# Altium footprint library TE0706.PcbLib: 46 footprints (part 1 of 3)
Each footprint in its own frame and in the unit in brackets; x right, y up, seen from the top. Pads: shape width x height; smd on the part's side, far side on the other; paste and mask are expansions set on the pad; w line width, h text height; cw(c..) or ccw(c..) is an arc to the next point about the centre after c.
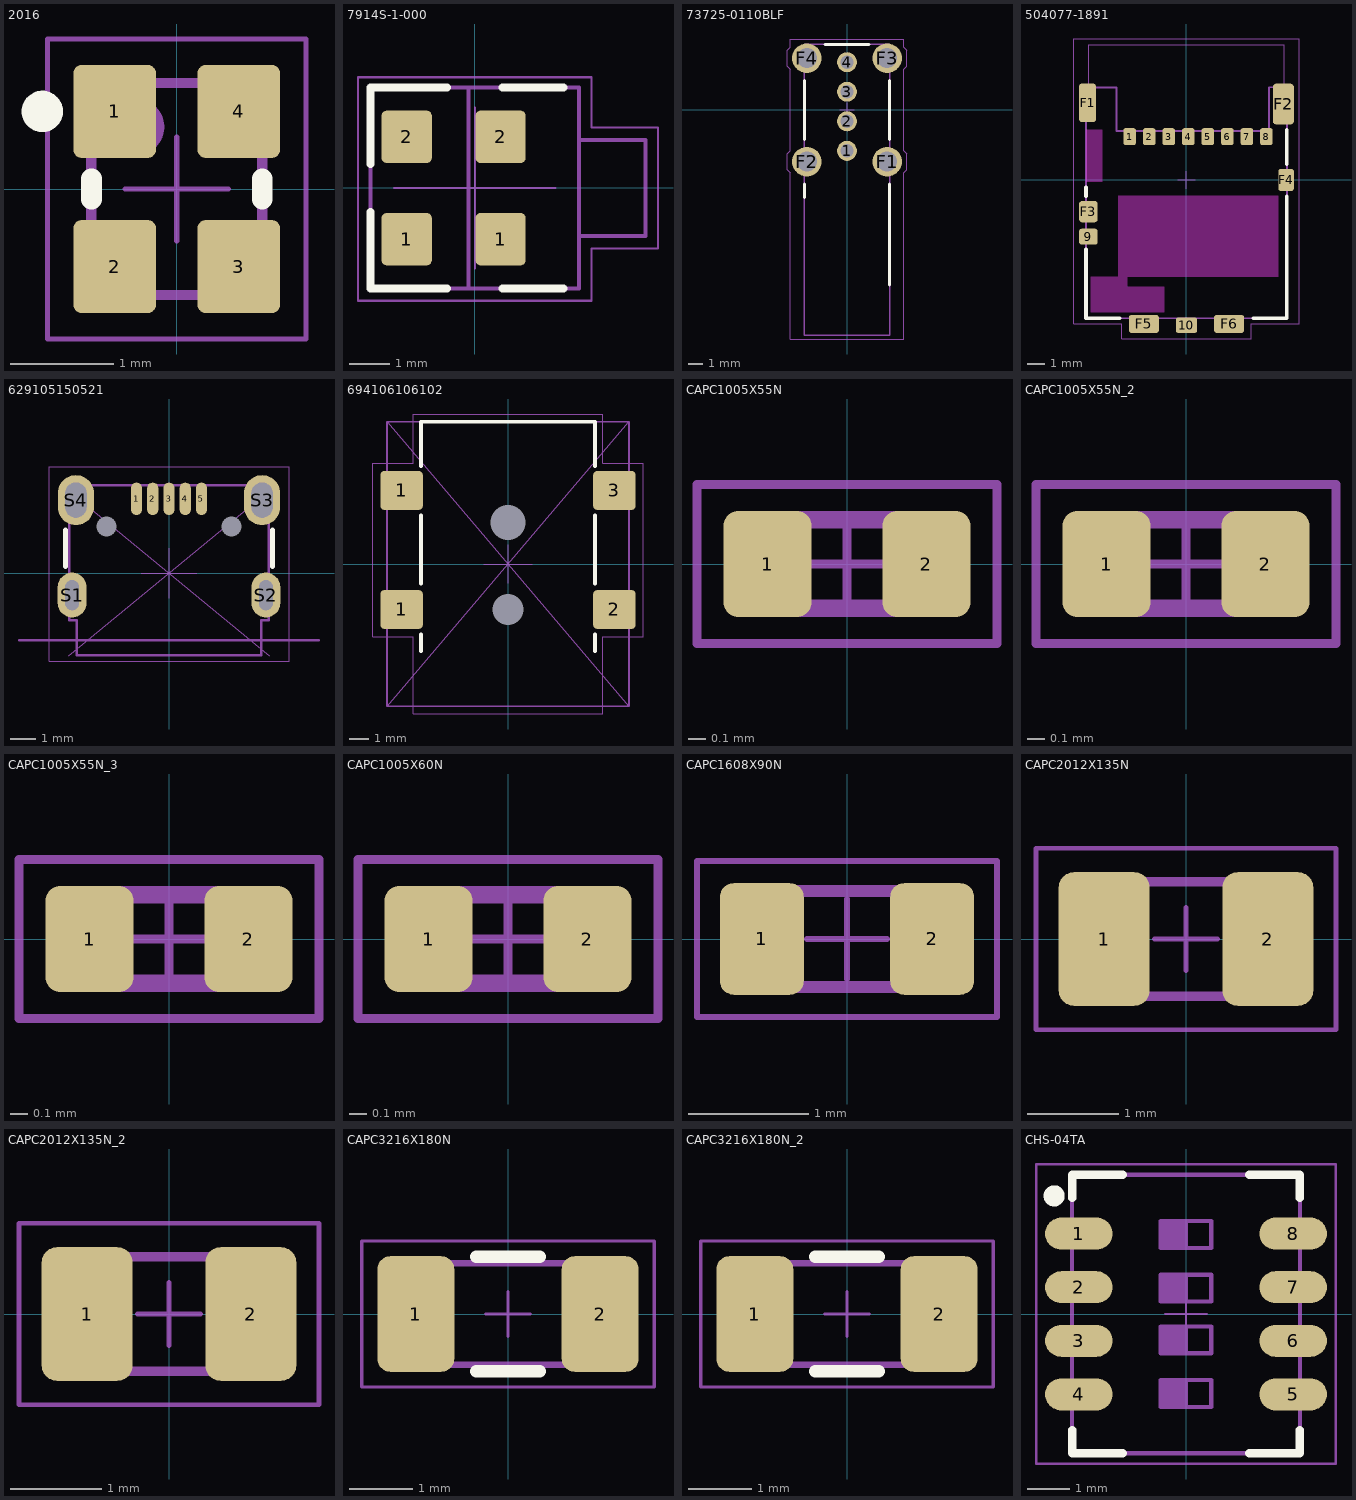
[diagram p0: the footprints below, top view; thin cyan lines are the x and y axes]

## 2016 [mm]
height 0.8
pads (4):
  rrect20% 0.8x0.9 smd: 1(-0.6,0.75) 2(-0.6,-0.75) 3(0.6,-0.75) 4(0.6,0.75)
Top Overlay:
  circle w0.2: c-1.3,0.75 r0.1
  lines w0.2: -0.825,-0.1 -0.825,0.1 ; 0.825,-0.1 0.825,0.1
Mechanical 13:
  circle w0.28: c-0.4,0.6 r0.14
  lines w0.1: -0.825,-1.025 -0.825,1.025 0.825,1.025 ; -0.825,-1.025 -0.825,-1.025 ; -0.825,-1.025 0.825,-1.025 0.825,1.025 ; 0.825,1.025 0.825,1.025
  text ".Designator" at -0.51,2.92 h1
Mechanical 15:
  lines w0.05: -0.5,0 0.5,0 ; 0,-0.5 0,0.5 ; -1.25,-1.45 1.25,-1.45 1.25,1.45 -1.25,1.45 -1.25,-1.45
3D body: height 0.81, standoff 0, extent -0.6,0.4 -0.2,0.798
3D body: height 0.8, standoff 0, extent -0.825,-1.025 0.825,1.025

## 7914S-1-000 [mm]
height 5.44
pads (4):
  rrect20% 1.25x1.3 smd: 1(-1.69,-1.27) 1(0.64,-1.27) 2(-1.69,1.27) 2(0.64,1.27)
Top Overlay:
  lines w0.2: -2.59,-0.6 -2.59,-2.5 -0.69,-2.5 ; -2.59,0.6 -2.59,2.5 -0.69,2.5 ; 0.69,-2.5 2.2,-2.5 ; 0.69,2.5 2.2,2.5
Mechanical 13:
  lines w0.1: -0.16,-2.5 -0.16,2.5 ; 2.59,-1.19 4.24,-1.19 4.24,1.19 2.59,1.19 ; -2.59,-2.5 2.59,-2.5 2.59,2.5 -2.59,2.5 -2.59,-2.5
  text ".Designator" at -0.82,-0.9 h1
Mechanical 15:
  lines w0.05: -2,0 2,0 ; 0,-2 0,2 ; -2.9,-2.8 -2.9,2.75 2.9,2.75 2.9,1.5 4.55,1.5 4.55,-1.5 2.9,-1.5 2.9,-2.8 -2.9,-2.8
3D body "7914S-1-000.stp": height 5.4, standoff -0.04, extent -2.6,-2.524 4.233,2.524

## 73725-0110BLF [mm]
height 13.83
pads (8):
  round 1.35 hole 0.9: 1(0,-2.77) 2(0,-0.77) 3(0,1.23) 4(0,3.23)
  round 2 hole 1.35: F1(2.72,-3.5) F2(-2.72,-3.5) F3(2.72,3.5) F4(-2.72,3.5)
Top Overlay:
  lines w0.2: -2.88,-5.921 -2.88,-5 ; -2.88,-2 -2.88,2 ; -1.5,4.44 1.5,4.44 ; 2.88,-11.851 2.88,-5 ; 2.88,-2 2.88,2
Mechanical 13:
  lines w0.1: -2.88,-15.26 2.88,-15.26 2.88,4.44 -2.88,4.44 -2.88,-15.26
  text ".Designator" at -0.98,-2.69 h1
Mechanical 15:
  lines w0.05: -0.5,0 0.5,0 ; 0,-0.5 0,0.5 ; -4.05,-4.05 -3.85,-4.25 -3.85,-15.5 3.85,-15.5 3.85,-4.25 4.05,-4.05 4.05,-2.95 3.85,-2.75 3.85,2.75 4.05,2.95 4.05,4.05 3.85,4.25 3.85,4.8 -3.85,4.8 -3.85,4.25 -4.05,4.05 -4.05,2.95 -3.85,2.75 -3.85,-2.75 -4.05,-2.95 -4.05,-4.05
3D body "73725-0110blfc.stp": height 14.55, standoff -3.26, extent -3.56,-15.26 3.56,4.44

## 504077-1891 [mm]
height 1.35
pads (16):
  rrect33% 0.7x0.95 smd: 1(-3.2,2.44) 2(-2.1,2.44) 3(-1,2.44) 4(0.1,2.44) 5(1.2,2.44) 6(2.3,2.44) 7(3.4,2.44) 8(4.5,2.44)
  rrect33% 1.05x0.9 smd: 9(-5.525,-3.195)
  rrect33% 1.2x0.88 smd: 10(0,-8.185)
  rrect33% 0.95x2.17 smd: F1(-5.575,4.34)
  rrect33% 1.19x2.3 smd: F2(5.455,4.275)
  rrect33% 1.05x1.2 smd: F3(-5.525,-1.785)
  rrect33% 0.88x1.25 smd: F4(5.61,0)
  rrect33% 1.7x1.03 smd: F5(-2.4,-8.11) F6(2.4,-8.11)
Top Layer keep-out:
  rectangle: -5.66,-0.125 -4.73,2.845
  region: -3.855,-0.89 -3.85,-0.895 5.17,-0.895 5.17,-5.445 -3.335,-5.445 -3.335,-6.025 -1.245,-6.025 -1.245,-7.445 -5.395,-7.445 -5.395,-5.445 -3.855,-5.445
Top Overlay:
  lines w0.2: -5.66,-3.91 -5.66,-7.785 -3.75,-7.785 ; -5.66,-0.91 -5.66,-0.41 ; 3.75,-7.785 5.66,-7.785 5.66,-0.91 ; 5.66,0.89 5.66,2.84
Mechanical 13:
  lines w0.05: -5.5,5.215 -5.5,7.615 5.5,7.615 5.5,5.215
  lines w0.1: -5.668,-7.785 5.66,-7.785 5.66,5.225 4.65,5.225 4.65,2.755 -3.95,2.755 -3.95,5.215 -5.66,5.215 -5.66,-7.785 ; -3.15,-7.785 -3.15,-8.285 -1.65,-8.285 -1.65,-7.785 ; -0.4,-7.785 -0.4,-8.285 0.4,-8.285 0.4,-7.785 ; 1.65,-7.785 1.65,-8.285 3.15,-8.285 3.15,-7.785
  text "LOCK POSITION" at -4.3,6.465 h0.7
  text ".Designator" at 1.2,-0.02 h1
Mechanical 15:
  lines w0.05: -0.5,0 0.5,0 ; 0,-0.5 0,0.5 ; -6.35,-8.11 -3.65,-8.11 -3.65,-8.96 3.65,-8.96 3.65,-8.11 6.35,-8.11 6.35,7.94 -6.35,7.94 -6.35,-8.11
3D body "5040771891.stp": height 1.26, standoff -0.02, extent -5.68,-8.26 5.7,5.24
3D body "SW3dPS-Micro_SD.STEP": height 1.05, standoff 0.07, extent -5.5,-7.385 5.5,7.615

## 629105150521 [mm]
height 2.675
pads (11):
  round 0 hole 0.8 unplated: 0(-2.5,1.873) 0(2.5,1.873)
  oval 0.45x1.3 smd: 1(-1.3,2.973) 2(-0.65,2.973) 3(0,2.973) 4(0.65,2.973) 5(1.3,2.973)
  oval 1.15x1.8 hole 0.55 slot 1.2 at 90 deg: S1(-3.875,-0.877) S2(3.875,-0.877)
  oval 1.45x2 hole 0.85 slot 1.4 at 90 deg: S3(3.725,2.923) S4(-3.725,2.923)
Top Overlay:
  lines w0.2: -4.15,0.258 -4.15,1.73 ; 4.15,0.258 4.15,1.73
Top Paste:
  region: -3.745,1.93 -3.679,1.927 -3.547,1.945 -3.42,1.988 -3.304,2.054 -3.203,2.14 -3.119,2.244 -3.057,2.362 -3.017,2.489 -3.01,2.555 -3.01,3.22 -3.013,3.326 -3.079,3.528 -3.201,3.702 -3.368,3.833 -3.566,3.91 -3.778,3.926 -3.986,3.88 -4.171,3.776 -4.245,3.7 -4.289,3.654 -4.36,3.548 -4.413,3.432 -4.445,3.309 -4.45,3.245 -4.45,2.55 -4.427,2.424 -4.302,2.202 -4.11,2.033 -3.873,1.936
  region: 3.705,1.93 3.771,1.927 3.903,1.945 4.03,1.988 4.146,2.054 4.247,2.14 4.331,2.244 4.393,2.362 4.433,2.489 4.44,2.555 4.44,3.22 4.437,3.326 4.371,3.528 4.249,3.702 4.082,3.833 3.884,3.91 3.672,3.926 3.464,3.88 3.279,3.776 3.205,3.7 3.161,3.654 3.09,3.548 3.037,3.432 3.005,3.309 3,3.245 3,2.55 3.023,2.424 3.148,2.202 3.34,2.033 3.577,1.936
  region: 3.86,-1.78 3.972,-1.78 4.181,-1.698 4.345,-1.545 4.442,-1.342 4.45,-1.23 4.45,-0.53 4.441,-0.421 4.347,-0.224 4.189,-0.072 3.989,0.014 3.88,0.02 3.772,0.017 3.572,-0.064 3.412,-0.21 3.313,-0.403 3.3,-0.51 3.3,-1.27 3.317,-1.372 3.415,-1.553 3.568,-1.692 3.757,-1.773
  region: -3.89,-1.78 -3.778,-1.78 -3.569,-1.698 -3.405,-1.545 -3.308,-1.342 -3.3,-1.23 -3.3,-0.53 -3.309,-0.421 -3.403,-0.224 -3.561,-0.072 -3.761,0.014 -3.87,0.02 -3.978,0.017 -4.178,-0.064 -4.338,-0.21 -4.437,-0.403 -4.45,-0.51 -4.45,-1.27 -4.433,-1.372 -4.335,-1.553 -4.182,-1.692 -3.993,-1.773
Mechanical 5:
  lines w0.1: -6,-2.677 6,-2.677
  text "PCB edge" at 6.23,-1.598 h1
Mechanical 13:
  lines w0.1: -4,-1.877 -3.7,-1.877 -3.7,-3.277 3.7,-3.277 3.7,-1.877 4,-1.877 4,3.523 -4,3.523 -4,-1.877
  text ".Designator" at -0.91,-0.17 h1
  text "1" at -1.44,2.58 h0.7
  text "5" at 1.08,2.51 h0.7
Mechanical 15:
  lines w0.05: -4,-3.302 4,3.302 ; -4,3.302 4,-3.302 ; -1.1,0 1.1,0 ; 0,-1 0,1 ; -4.8,-3.532 -4.8,4.268 4.8,4.268 4.8,-3.532 -4.8,-3.532
3D body "629105150521.stp": height 2.71, standoff -0.85, extent -4,-3.302 4,3.302

## 694106106102 [mm]
height 1.42
pads (6):
  rrect20% 2.2x2 smd: 1(-5.5,-2.35) 1(-5.5,3.8) 2(5.5,-2.35) 3(5.5,3.8)
  round 0 hole 1.6 unplated: H1(0,-2.35)
  round 0 hole 1.8 unplated: H2(0,2.15)
Top Overlay:
  lines w0.2: -4.5,-4.5 -4.5,-3.65 ; -4.5,-1 -4.5,2.5 ; -4.5,5.05 -4.5,7.35 4.5,7.351 4.5,5.051 ; 4.5,-4.5 4.5,-3.65 ; 4.5,-1 4.5,2.5
Mechanical 13:
  lines w0.1: -6.25,-7.35 6.25,-7.35 6.25,7.35 -6.25,7.35 -6.25,-7.35
  text ".Designator" at -0.1,-0.1 h1
Mechanical 15:
  lines w0.05: -6.25,-7.35 6.25,7.35 ; -6.25,7.35 6.25,-7.35 ; -1.25,0 1.25,0 ; 0,-1 0,1 ; -7,-3.75 -4.9,-3.75 -4.9,-7.75 4.9,-7.75 4.9,-6.7 4.9,-3.75 7,-3.75 7,5.2 4.9,5.2 4.9,7.75 -4.9,7.75 -4.9,5.2 -7,5.2 -7,-3.75
3D body "694106106102.stp": height 11, standoff -1.2, extent -6.25,-7.35 6.25,7.35

## CAPC1005X55N [mm] "Vishay VJ0402 1 x 0.5mm (+/- 0.05), 0.25mm +0.05/-0.1mm Kontakte"
height 0.55
pads (2):
  rrect33% 0.5x0.6 smd: 1(-0.45,0) 2(0.45,0)
Mechanical 13:
  lines w0.1: -0.3,-0.25 -0.3,0.25 ; 0.3,-0.25 0.3,0.25 ; -0.5,-0.25 -0.5,0.25 0.5,0.25 0.5,-0.25 -0.5,-0.25
  text ".Designator" at 1.05,-0.36 h0.7
Mechanical 15:
  lines w0.05: -0.225,0 0.225,0 ; 0,-0.225 0,0.225 ; -0.85,-0.45 -0.85,0.45 0.85,0.45 0.85,-0.45 -0.85,-0.45
3D body "User Library-SMD CAPACITOR0402.STEP": height 0.5, standoff 0, extent -0.5,-0.25 0.5,0.25

## CAPC1005X55N_2 [mm]
pads (2):
  rrect33% 0.5x0.6 smd: 1(-0.45,0) 2(0.45,0)
Mechanical 13:
  lines w0.1: -0.3,-0.25 -0.3,0.25 ; 0.3,-0.25 0.3,0.25 ; -0.5,-0.25 0.5,-0.25 0.5,0.25 -0.5,0.25 -0.5,-0.25
  text ".Designator" at -2.55,-0.4 h0.7
Mechanical 15:
  lines w0.05: -0.225,0 0.225,0 ; 0,-0.225 0,0.225 ; -0.85,-0.45 0.85,-0.45 0.85,0.45 -0.85,0.45 -0.85,-0.45
3D body "User Library-SMD CAPACITOR0402.STEP": height 0.5, standoff 0, extent -0.5,-0.25 0.5,0.25

## CAPC1005X55N_3 [mm]
pads (2):
  rrect33% 0.5x0.6 smd: 1(-0.45,0) 2(0.45,0)
Mechanical 13:
  lines w0.1: -0.3,-0.25 -0.3,0.25 ; 0.3,-0.25 0.3,0.25 ; -0.5,-0.25 0.5,-0.25 0.5,0.25 -0.5,0.25 -0.5,-0.25
  text ".Designator" at -0.95,0.65 h0.7
Mechanical 15:
  lines w0.05: -0.225,0 0.225,0 ; 0,-0.225 0,0.225 ; -0.85,-0.45 0.85,-0.45 0.85,0.45 -0.85,0.45 -0.85,-0.45
3D body "User Library-SMD CAPACITOR0402.STEP": height 0.5, standoff 0, extent -0.5,-0.25 0.5,0.25

## CAPC1005X60N [mm] "Vishay VJ0402 1 x 0.5mm (+/- 0.05), 0.25mm +0.05/-0.1mm Kontakte"
height 0.55
pads (2):
  rrect33% 0.5x0.6 smd: 1(-0.45,0) 2(0.45,0)
Mechanical 13:
  lines w0.1: -0.3,-0.25 -0.3,0.25 ; 0.3,-0.25 0.3,0.25 ; -0.5,-0.25 -0.5,0.25 0.5,0.25 0.5,-0.25 -0.5,-0.25
  text ".Designator" at -0.9,0.6 h0.7
Mechanical 15:
  lines w0.05: -0.225,0 0.225,0 ; 0,-0.225 0,0.225 ; -0.85,-0.45 -0.85,0.45 0.85,0.45 0.85,-0.45 -0.85,-0.45
3D body "User Library-SMD CAPACITOR0402.STEP": height 0.5, standoff 0, extent -0.5,-0.25 0.5,0.25

## CAPC1608X90N [mm] "Vishay VJ0603 1.6 x 0.8 (+0.15/-0.1) 0.4 +/- 0,15mm Kontakte"
height 0.9
pads (2):
  rrect33% 0.7x0.93 smd: 1(-0.71,0) 2(0.71,0)
Mechanical 13:
  lines w0.1: -0.5,-0.4 -0.5,0.4 ; 0.5,-0.4 0.5,0.4 ; -0.8,-0.4 -0.8,0.4 0.8,0.4 0.8,-0.4 -0.8,-0.4
  text ".Designator" at -0.925,0.65 h0.7
Mechanical 15:
  lines w0.05: -0.333,0 0.333,0 ; 0,-0.332 0,0.333 ; -1.25,-0.65 -1.25,0.65 1.25,0.65 1.25,-0.65 -1.25,-0.65
3D body "User Library-SMD CAPACITOR0603.STEP": height 0.8, standoff 0, extent -0.8,-0.4 0.8,0.4

## CAPC2012X135N [mm] "Vishay VJ0805 2 x 1.25 +/- 0.15, 0.5 +/- 0,2 Kontakte"
height 1.35
pads (2):
  rrect33% 1x1.47 smd: 1(-0.9,0) 2(0.9,0)
Mechanical 13:
  lines w0.1: -0.6,-0.625 -0.6,0.625 ; 0.6,-0.625 0.6,0.63 ; -1,-0.63 1,-0.63 1,0.63 -1,0.63 -1,-0.63
  text ".Designator" at -0.49,-1.62 h0.7
Mechanical 15:
  lines w0.05: -0.35,0 0.35,0 ; 0,-0.35 0,0.35 ; -1.65,-1 1.65,-1 1.65,1 -1.65,1 -1.65,-1
3D body "User Library-SMD CAPACITOR0805.STEP": height 1.1, standoff 0.5, extent -1,-0.625 1,0.625
3D body "User Library-SMD CAPACITOR0805.STEP": height 0.6, standoff 0, extent -1,-0.625 1,0.625

## CAPC2012X135N_2 [mm]
pads (2):
  rrect33% 1x1.47 smd: 1(-0.9,0) 2(0.9,0)
Mechanical 13:
  lines w0.1: -0.6,-0.625 -0.6,0.625 ; 0.6,-0.625 0.6,0.63 ; -1,-0.63 1,-0.63 1,0.63 -1,0.63 -1,-0.63
  text ".Designator" at -0.95,0.95 h0.7
Mechanical 15:
  lines w0.05: -0.35,0 0.35,0 ; 0,-0.35 0,0.35 ; -1.65,-1 1.65,-1 1.65,1 -1.65,1 -1.65,-1
3D body "User Library-SMD CAPACITOR0805.STEP": height 1.1, standoff 0.5, extent -1,-0.625 1,0.625
3D body "User Library-SMD CAPACITOR0805.STEP": height 0.6, standoff 0, extent -1,-0.625 1,0.625

## CAPC3216X180N [mm]
height 1.8
pads (2):
  rrect33% 1.21x1.82 smd: 1(-1.45,0) 2(1.45,0)
Top Overlay:
  lines w0.2: -0.5,-0.9 0.5,-0.9 ; -0.5,0.9 0.5,0.9
Mechanical 13:
  lines w0.1: -1.1,-0.8 -1.1,0.8 ; 1.1,-0.8 1.1,0.8 ; -1.6,-0.8 -1.6,0.8 1.6,0.8 1.6,-0.8 -1.6,-0.8
  text ".Designator" at -0.84,-1.83 h0.7
Mechanical 15:
  lines w0.05: -0.35,0 0.35,0 ; 0,-0.35 0,0.35 ; -2.3,-1.15 -2.3,1.15 2.3,1.15 2.3,-1.15 -2.3,-1.15
3D body "User Library-CAPC3216X___CAPC3216X180N.STEP": height 1.82, standoff 0, extent -1.6,-0.81 1.6,0.81

## CAPC3216X180N_2 [mm]
pads (2):
  rrect33% 1.21x1.82 smd: 1(-1.45,0) 2(1.45,0)
Top Overlay:
  lines w0.2: -0.5,-0.9 0.5,-0.9 ; -0.5,0.9 0.5,0.9
Mechanical 13:
  lines w0.1: -1.1,-0.8 -1.1,0.8 ; 1.1,-0.8 1.1,0.8 ; -1.6,-0.8 1.6,-0.8 1.6,0.8 -1.6,0.8 -1.6,-0.8
  text ".Designator" at -1.4,1.1 h0.7
Mechanical 15:
  lines w0.05: -0.35,0 0.35,0 ; 0,-0.35 0,0.35 ; -2.3,-1.15 2.3,-1.15 2.3,1.15 -2.3,1.15 -2.3,-1.15
3D body "User Library-CAPC3216X___CAPC3216X180N.STEP": height 1.82, standoff 0, extent -1.6,-0.81 1.6,0.81

## CHS-04TA [mm]
height 2.5
pads (8):
  oval 1.6x0.76 smd: 1(-2.54,1.905) 2(-2.54,0.635) 3(-2.54,-0.635) 4(-2.54,-1.905) 5(2.54,-1.905) 6(2.54,-0.635) 7(2.54,0.635) 8(2.54,1.905)
Top Overlay:
  circle w0.25: c-3.125,2.8 r0.125
  lines w0.2: -2.7,-2.75 -2.7,-3.3 -1.5,-3.3 ; -2.7,2.75 -2.7,3.3 -1.5,3.3 ; 1.5,-3.3 2.7,-3.3 2.7,-2.75 ; 1.5,3.3 2.7,3.3 2.7,2.75
Mechanical 13:
  rectangle: -0.6,0.297 0,0.932
  rectangle: -0.6,1.567 0,2.202
  rectangle: -0.6,-2.203 0,-1.568
  rectangle: -0.6,-0.933 0,-0.298
  lines w0.1: -2.7,-2.105 -2.9,-2.105 -2.9,-1.705 -2.7,-1.705 ; -2.7,-0.835 -2.9,-0.835 -2.9,-0.435 -2.7,-0.435 ; -2.7,0.435 -2.9,0.435 -2.9,0.835 -2.7,0.835 ; -2.7,1.705 -2.9,1.705 -2.9,2.105 -2.7,2.105 ; 0,-2.202 0,-1.567 ; 0,-0.932 0,-0.297 ; 0,0.297 0,0.932 ; 0,1.567 0,2.202 ; 2.7,-2.105 2.9,-2.105 2.9,-1.705 2.7,-1.705 ; 2.7,-0.835 2.9,-0.835 2.9,-0.435 2.7,-0.435 ; 2.7,0.435 2.9,0.435 2.9,0.835 2.7,0.835 ; 2.7,1.705 2.9,1.705 2.9,2.105 2.7,2.105 ; -2.7,-3.3 -2.7,3.3 2.7,3.3 2.7,-3.3 -2.7,-3.3 ; -0.6,-2.202 -0.6,-1.567 0.6,-1.567 0.6,-2.202 -0.6,-2.202 ; -0.6,-0.932 -0.6,-0.297 0.6,-0.297 0.6,-0.932 -0.6,-0.932 ; -0.6,0.297 0.6,0.297 0.6,0.932 -0.6,0.932 -0.6,0.297 ; -0.6,1.567 -0.6,2.202 0.6,2.202 0.6,1.567 -0.6,1.567
  text ".Designator" at 1.05,-2.548 h1
  text "N" at 1.587,0.297 h1
  text "O" at 1.587,1.567 h1
  text "2" at -2.222,0.297 h1
  text "1" at -2.222,1.567 h1
  text "3" at -2.222,-0.953 h1
  text "4" at -2.222,-2.222 h1
Mechanical 15:
  lines w0.05: -3.55,-3.556 -3.55,3.556 ; -3.55,-3.55 3.55,-3.55 ; -3.55,3.55 3.55,3.55 ; -0.5,0 0.5,0 ; 0,-0.5 0,0.5 ; 3.55,-3.556 3.55,3.556
3D body "CHS-04TA1.stp": height 2.5, standoff -0.02, extent -2.8,-3.3 2.8,3.3